# Altium footprint library LHAC-4XDSP2XV7-VP5_0226_3.PcbLib: 96 footprints (part 9 of 12) (continued)
## LCC28_1 [mil] "LCC28_1" (continued)
  text "2" at -70,247.52 h25
  text "1" at -20,227.52 h25
  text "5" at -266.06,151.46 h25
  text "7" at -266.06,51.46 h25
  text "10" at -286.06,-98.54 h25
  text "12" at -190,-244.6 h25
  text "16" at 10,-244.6 h25
  text "28" at 10,247.52 h25
  text "15" at -40,-244.6 h25
  text "27" at 60,247.52 h25
Mechanical 16:
  lines w1: -255,-255 255,-255 255,259 -255,259 -255,-255
Mechanical 17:
  text "***" at -50,-110 h30
  text "***" at -50,-80 h30
  text "SJ006" at -50,-50 h30
  text "SW128_2_LCC28_1_SJ006" at -50,-20 h30
  text ".Designator" at 42.5,12.34 h30

## LED0603 [mil] "LED0603"
pads (2):
  rect 30x32 smd: 1(-30,0) 2(30,0)

## LFCSP64VQ-P0_5-9X9 [mil] "LFCSP64VQ-P0_5-9X9"
pads (65):
  oval 31.5x11.81 smd: 1(-175.2,147.64) 2(-175.2,127.95) 3(-175.2,108.27) 4(-175.2,88.58) 5(-175.2,68.9) 6(-175.2,49.21) 7(-175.2,29.53) 8(-175.2,9.84) 9(-175.2,-9.84) 10(-175.2,-29.53) 11(-175.2,-49.21) 12(-175.2,-68.9) 13(-175.2,-88.58) 14(-175.2,-108.27) 15(-175.2,-127.95) 16(-175.2,-147.64) 33(175.2,-147.64) 34(175.2,-127.95) 35(175.2,-108.27) 36(175.2,-88.58) 37(175.2,-68.9) 38(175.2,-49.21) 39(175.2,-29.53) 40(175.2,-9.84) 41(175.2,9.84) 42(175.2,29.53) 43(175.2,49.21) 44(175.2,68.9) 45(175.2,88.58) 46(175.2,108.27) 47(175.2,127.95) 48(175.2,147.64)
  oval 11.81x31.5 smd: 17(-147.64,-175.2) 18(-127.95,-175.2) 19(-108.27,-175.2) 20(-88.58,-175.2) 21(-68.9,-175.2) 22(-49.21,-175.2) 23(-29.53,-175.2) 24(-9.84,-175.2) 25(9.84,-175.2) 26(29.53,-175.2) 27(49.21,-175.2) 28(68.9,-175.2) 29(88.58,-175.2) 30(108.27,-175.2) 31(127.95,-175.2) 32(147.64,-175.2) 49(147.64,175.2) 50(127.95,175.2) 51(108.27,175.2) 52(88.58,175.2) 53(68.9,175.2) 54(49.21,175.2) 55(29.53,175.2) 56(9.84,175.2) 57(-9.84,175.2) 58(-29.53,175.2) 59(-49.21,175.2) 60(-68.9,175.2) 61(-88.58,175.2) 62(-108.27,175.2) 63(-127.95,175.2) 64(-147.64,175.2)
  rect 297.24x297.24 smd: 65(0,0)
via -21.65,21.65 diameter 18 hole 10
via 21.65,-21.65 diameter 18 hole 10
via 21.65,21.65 diameter 18 hole 10
via -21.65,-21.65 diameter 18 hole 10
via 76.77,21.65 diameter 18 hole 10
via 76.77,-21.65 diameter 18 hole 10
via 120.08,21.65 diameter 18 hole 10
via 120.08,-21.65 diameter 18 hole 10
via 76.77,120.08 diameter 18 hole 10
via 76.77,76.77 diameter 18 hole 10
via 120.08,120.08 diameter 18 hole 10
via 120.08,76.77 diameter 18 hole 10
via -21.65,120.08 diameter 18 hole 10
via -21.65,76.77 diameter 18 hole 10
via 21.65,120.08 diameter 18 hole 10
via 21.65,76.77 diameter 18 hole 10
via -120.08,120.08 diameter 18 hole 10
via -120.08,76.77 diameter 18 hole 10
via -76.77,120.08 diameter 18 hole 10
via -76.77,76.77 diameter 18 hole 10
via -120.08,21.65 diameter 18 hole 10
via -120.08,-21.65 diameter 18 hole 10
via -76.77,21.65 diameter 18 hole 10
via -76.77,-21.65 diameter 18 hole 10
via -120.08,-76.77 diameter 18 hole 10
via -120.08,-120.08 diameter 18 hole 10
via -76.77,-76.77 diameter 18 hole 10
via -76.77,-120.08 diameter 18 hole 10
via -21.65,-76.77 diameter 18 hole 10
via -21.65,-120.08 diameter 18 hole 10
via 21.65,-76.77 diameter 18 hole 10
via 76.77,-76.77 diameter 18 hole 10
via 76.77,-120.08 diameter 18 hole 10
via 120.08,-76.77 diameter 18 hole 10
via 120.08,-120.08 diameter 18 hole 10
Top Overlay:
  circle w7: c-226,154 r11.4
  lines w7.87: -202.76,-202.76 -202.76,-155.51 -202.76,153.54 -155.51,202.76 202.76,202.76 202.76,-202.76 -202.76,-202.76
  text ".Designator" at -35,215 h25
Top Paste:
  pour cut-out: -137.8,137.8 -137.8,59.06 -59.06,59.06 -59.06,137.8
  pour cut-out: -137.8,39.37 -137.8,-39.37 -59.06,-39.37 -59.06,39.37
  pour cut-out: -137.8,-59.06 -137.8,-137.8 -59.06,-137.8 -59.06,-59.06
  pour cut-out: -39.37,-59.06 -39.37,-137.8 39.37,-137.8 39.37,-59.06
  pour cut-out: 59.06,-59.06 59.06,-137.8 137.8,-137.8 137.8,-59.06
  pour cut-out: 59.06,39.37 59.06,-39.37 137.8,-39.37 137.8,39.37
  pour cut-out: 59.06,137.8 59.06,59.06 137.8,59.06 137.8,137.8
  pour cut-out: -39.37,137.8 -39.37,59.06 39.37,59.06 39.37,137.8
  pour cut-out: -39.37,39.37 -39.37,-39.37 39.37,-39.37 39.37,39.37
Mechanical 5:
  lines w7: -237.4,154 cw(c-226,154) -226,165.4 cw(c-226,154) -214.6,154 cw(c-226,154) -226,142.6 cw(c-226,154) -237.4,154
  lines w7.87: -202.76,-202.76 -202.76,-155.51 -202.76,153.54 -155.51,202.76 202.76,202.76 202.76,-202.76 -202.76,-202.76
  text "U122" at -35,215 h25
Mechanical 14:
  text "50" at 119.95,175.2 h10
  text "48" at 167.2,147.64 h10
  text "46" at 167.2,108.27 h10
  text "63" at -135.95,175.2 h10
  text "3" at -179.2,108.27 h10
  text "1" at -179.2,147.64 h10
  text "4" at -179.2,88.58 h10
  text "51" at 100.27,175.2 h10
  text "53" at 60.9,175.2 h10
  text "59" at -57.21,175.2 h10
  text "56" at 1.84,175.2 h10
  text "52" at 80.58,175.2 h10
  text "57" at -17.84,175.2 h10
  text "58" at -37.53,175.2 h10
  text "54" at 41.21,175.2 h10
  text "44" at 167.2,68.9 h10
  text "55" at 21.53,175.2 h10
  text "14" at -183.2,-108.27 h10
  text "13" at -183.2,-88.58 h10
  text "35" at 167.2,-108.27 h10
  text "41" at 167.2,9.84 h10
  text "25" at 1.84,-175.2 h10
  text "24" at -17.84,-175.2 h10
  text "6" at -179.2,49.21 h10
  text "29" at 80.58,-175.2 h10
  text "5" at -179.2,68.9 h10
  text "22" at -57.21,-175.2 h10
  text "18" at -135.95,-175.2 h10
  text "33" at 167.2,-147.64 h10
  text "31" at 119.95,-175.2 h10
  text "27" at 41.21,-175.2 h10
  text "40" at 167.2,-9.84 h10
  text "38" at 167.2,-49.21 h10
  text "16" at -183.2,-147.64 h10
  text "11" at -183.2,-49.21 h10
  text "30" at 100.27,-175.2 h10
  text "21" at -76.9,-175.2 h10
  text "36" at 167.2,-88.58 h10
  text "17" at -155.64,-175.2 h10
  text "32" at 139.64,-175.2 h10
  text "34" at 167.2,-127.95 h10
  text "37" at 167.2,-68.9 h10
  text "19" at -116.27,-175.2 h10
  text "26" at 21.53,-175.2 h10
  text "28" at 60.9,-175.2 h10
  text "23" at -37.53,-175.2 h10
  text "20" at -96.58,-175.2 h10
  text "15" at -183.2,-127.95 h10
  text "12" at -183.2,-68.9 h10
  text "65" at -16,0 h10
  text "64" at -155.64,175.2 h10
  text "60" at -76.9,175.2 h10
  text "47" at 167.2,127.95 h10
  text "49" at 139.64,175.2 h10
  text "2" at -179.2,127.95 h10
  text "7" at -179.2,29.53 h10
  text "61" at -96.58,175.2 h10
  text "62" at -116.27,175.2 h10
  text "43" at 167.2,49.21 h10
  text "42" at 167.2,29.53 h10
  text "45" at 167.2,88.58 h10
  text "8" at -179.2,9.84 h10
  text "9" at -179.2,-9.84 h10
  text "10" at -183.2,-29.53 h10
  text "39" at 167.2,-29.53 h10
Mechanical 16:
  drawing of 201 lines, arcs and shapes, not listed
3D body: height 150, standoff 0, extent -190.94,-190.94 190.94,190.94

## LT1963A-S8 [mil]
pads (8):
  rect 70x30 smd: 1(-104.33,75) 2(-104.33,25) 3(-104.33,-25) 4(-104.33,-75) 5(104.33,-75) 6(104.33,-25) 7(104.33,25) 8(104.33,75)
Top Overlay:
  lines w7: -40,-98.43 -40,98.43 ; -170,55 -150,75 -170,95 -170,55 ; -54.02,-98.43 -54.02,98.43 54.2,98.43 54.2,-98.43 -54.02,-98.43

## LTM4644 [mil] "LTM4644"
pads (77):
  round 25 smd: A1(-150,250) A2(-100,250) A3(-50,250) A4(0,250) A5(50,250) A6(100,250) A7(150,250) B1(-150,200) B2(-100,200) B3(-50,200) B4(0,200) B5(50,200) B6(100,200) B7(150,200) C1(-150,150) C2(-100,150) C3(-50,150) C4(0,150) C5(50,150) C6(100,150) C7(150,150) D1(-150,100) D2(-100,100) D3(-50,100) D4(0,100) D5(50,100) D6(100,100) D7(150,100) E1(-150,50) E2(-100,50) E3(-50,50) E4(0,50) E5(50,50) E6(100,50) E7(150,50) F1(-150,0) F2(-100,0) F3(-50,0) F4(0,0) F5(50,0) F6(100,0) F7(150,0) G1(-150,-50) G2(-100,-50) G3(-50,-50) G4(0,-50) G5(50,-50) G6(100,-50) G7(150,-50) H1(-150,-100) H2(-100,-100) H3(-50,-100) H4(0,-100) H5(50,-100) H6(100,-100) H7(150,-100) J1(-150,-150) J2(-100,-150) J3(-50,-150) J4(0,-150) J5(50,-150) J6(100,-150) J7(150,-150) K1(-150,-200) K2(-100,-200) K3(-50,-200) K4(0,-200) K5(50,-200) K6(100,-200) K7(150,-200) L1(-150,-250) L2(-100,-250) L3(-50,-250) L4(0,-250) L5(50,-250) L6(100,-250) L7(150,-250)
Top Overlay:
  lines w1.97: -157.48,295.28 -177.17,275.59 -177.17,255.91 ; -177.17,255.91 -137.8,295.28 -177.17,255.91 ; -177.17,-295.28 177.17,-295.28 177.17,295.28 -177.17,295.28 -177.17,-295.28
  lines w9.84: -216.54,300.59 ccw(c-196.85,300.6) -196.85,280.91 ccw(c-196.85,300.59) -177.17,300.59 ccw(c-196.85,300.6) -196.85,320.28 ccw(c-196.85,300.59) -216.54,300.59
Mechanical 17:
  text "LTM4644IY" at 300,190 h25

## LTM4677 [mm] "LTM4677"
pads (144):
  round 0.62 smd: A1(-6.985,6.985) A2(-5.715,6.985) A3(-4.445,6.985) A4(-3.175,6.985) A5(-1.905,6.985) A6(-0.635,6.985) A7(0.635,6.985) A8(1.905,6.985) A9(3.175,6.985) A10(4.445,6.985) A11(5.715,6.985) A12(6.985,6.985) B1(-6.985,5.715) B2(-5.715,5.715) B3(-4.445,5.715) B4(-3.175,5.715) B5(-1.905,5.715) B6(-0.635,5.715) B7(0.635,5.715) B8(1.905,5.715) B9(3.175,5.715) B10(4.445,5.715) B11(5.715,5.715) B12(6.985,5.715) C1(-6.985,4.445) C2(-5.715,4.445) C3(-4.445,4.445) C4(-3.175,4.445) C5(-1.905,4.445) C6(-0.635,4.445) C7(0.635,4.445) C8(1.905,4.445) C9(3.175,4.445) C10(4.445,4.445) C11(5.715,4.445) C12(6.985,4.445) D1(-6.985,3.175) D2(-5.715,3.175) D3(-4.445,3.175) D4(-3.175,3.175) D5(-1.905,3.175) D6(-0.635,3.175) D7(0.635,3.175) D8(1.905,3.175) D9(3.175,3.175) D10(4.445,3.175) D11(5.715,3.175) D12(6.985,3.175) E1(-6.985,1.905) E2(-5.715,1.905) E3(-4.445,1.905) E4(-3.175,1.905) E5(-1.905,1.905) E6(-0.635,1.905) E7(0.635,1.905) E8(1.905,1.905) E9(3.175,1.905) E10(4.445,1.905) E11(5.715,1.905) E12(6.985,1.905) F1(-6.985,0.635) F2(-5.715,0.635) F3(-4.445,0.635) F4(-3.175,0.635) F5(-1.905,0.635) F6(-0.635,0.635) F7(0.635,0.635) F8(1.905,0.635) F9(3.175,0.635) F10(4.445,0.635) F11(5.715,0.635) F12(6.985,0.635) G1(-6.985,-0.635) G2(-5.715,-0.635) G3(-4.445,-0.635) G4(-3.175,-0.635) G5(-1.905,-0.635) G6(-0.635,-0.635) G7(0.635,-0.635) G8(1.905,-0.635) G9(3.175,-0.635) G10(4.445,-0.635) G11(5.715,-0.635) G12(6.985,-0.635) H1(-6.985,-1.905) H2(-5.715,-1.905) H3(-4.445,-1.905) H4(-3.175,-1.905) H5(-1.905,-1.905) H6(-0.635,-1.905) H7(0.635,-1.905) H8(1.905,-1.905) H9(3.175,-1.905) H10(4.445,-1.905) H11(5.715,-1.905) H12(6.985,-1.905) J1(-6.985,-3.175) J2(-5.715,-3.175) J3(-4.445,-3.175) J4(-3.175,-3.175) J5(-1.905,-3.175) J6(-0.635,-3.175) J7(0.635,-3.175) J8(1.905,-3.175) J9(3.175,-3.175) J10(4.445,-3.175) J11(5.715,-3.175) J12(6.985,-3.175) K1(-6.985,-4.445) K2(-5.715,-4.445) K3(-4.445,-4.445) K4(-3.175,-4.445) K5(-1.905,-4.445) K6(-0.635,-4.445) K7(0.635,-4.445) K8(1.905,-4.445) K9(3.175,-4.445) K10(4.445,-4.445) K11(5.715,-4.445) K12(6.985,-4.445) L1(-6.985,-5.715) L2(-5.715,-5.715) L3(-4.445,-5.715) L4(-3.175,-5.715) L5(-1.905,-5.715) L6(-0.635,-5.715) L7(0.635,-5.715) L8(1.905,-5.715) L9(3.175,-5.715) L10(4.445,-5.715) L11(5.715,-5.715) L12(6.985,-5.715) M1(-6.985,-6.985) M2(-5.715,-6.985) M3(-4.445,-6.985) M4(-3.175,-6.985) M5(-1.905,-6.985) M6(-0.635,-6.985) M7(0.635,-6.985) M8(1.905,-6.985) M9(3.175,-6.985) M10(4.445,-6.985) M11(5.715,-6.985) M12(6.985,-6.985)
via -3.81,2.54 diameter 0.559 hole 0.305
via -1.27,1.27 diameter 0.559 hole 0.305
via -7.62,-3.81 diameter 0.559 hole 0.305
via -6.35,-3.81 diameter 0.559 hole 0.305
via -5.08,-3.81 diameter 0.559 hole 0.305
via -7.62,-5.08 diameter 0.559 hole 0.305
via -6.35,-5.08 diameter 0.559 hole 0.305
via -5.08,-5.08 diameter 0.559 hole 0.305
via -7.62,-6.35 diameter 0.559 hole 0.305
via -6.35,-6.35 diameter 0.559 hole 0.305
via -5.08,-6.35 diameter 0.559 hole 0.305
via -7.62,-7.62 diameter 0.559 hole 0.305
via -6.35,-7.62 diameter 0.559 hole 0.305
via -5.08,-7.62 diameter 0.559 hole 0.305
via -7.62,7.62 diameter 0.559 hole 0.305
via -6.35,7.62 diameter 0.559 hole 0.305
via -5.08,7.62 diameter 0.559 hole 0.305
via -5.08,3.81 diameter 0.559 hole 0.305
via -6.35,3.81 diameter 0.559 hole 0.305
via -7.62,3.81 diameter 0.559 hole 0.305
via -5.08,5.08 diameter 0.559 hole 0.305
via -6.35,5.08 diameter 0.559 hole 0.305
via -7.62,5.08 diameter 0.559 hole 0.305
via -5.08,6.35 diameter 0.559 hole 0.305
via -6.35,6.35 diameter 0.559 hole 0.305
via -7.62,6.35 diameter 0.559 hole 0.305
via 3.81,3.81 diameter 0.559 hole 0.305
via 3.81,-2.54 diameter 0.559 hole 0.305
via -3.81,1.27 diameter 0.559 hole 0.305
via -2.54,2.54 diameter 0.559 hole 0.305
via -2.54,1.27 diameter 0.559 hole 0.305
via -2.54,-7.62 diameter 0.559 hole 0.305
via -1.27,3.81 diameter 0.559 hole 0.305
via 2.54,3.81 diameter 0.559 hole 0.305
via -2.54,-3.81 diameter 0.559 hole 0.305
via 2.54,-3.81 diameter 0.559 hole 0.305
via -1.27,-1.27 diameter 0.559 hole 0.305
via -2.54,-1.27 diameter 0.559 hole 0.305
via -1.27,-5.08 diameter 0.559 hole 0.305
via -6.35,1.27 diameter 0.559 hole 0.305
via -2.54,3.81 diameter 0.559 hole 0.305
via -3.81,-2.54 diameter 0.559 hole 0.305
via 1.27,-3.81 diameter 0.559 hole 0.305
via -6.35,2.54 diameter 0.559 hole 0.305
via -6.35,-1.27 diameter 0.559 hole 0.305
via -1.27,-2.54 diameter 0.559 hole 0.305
via -2.54,-2.54 diameter 0.559 hole 0.305
via -6.35,-2.54 diameter 0.559 hole 0.305
via -3.81,-1.27 diameter 0.559 hole 0.305
via -2.54,7.62 diameter 0.559 hole 0.305
via -1.27,2.54 diameter 0.559 hole 0.305
via 2.54,2.54 diameter 0.559 hole 0.305
via 2.54,-2.54 diameter 0.559 hole 0.305
via 1.27,-2.54 diameter 0.559 hole 0.305
via 1.27,2.54 diameter 0.559 hole 0.305
via 7.62,-7.62 diameter 0.559 hole 0.305
via 6.35,-7.62 diameter 0.559 hole 0.305
via 7.62,-6.35 diameter 0.559 hole 0.305
via 6.35,-6.35 diameter 0.559 hole 0.305
via 7.62,-5.08 diameter 0.559 hole 0.305
via 6.35,-5.08 diameter 0.559 hole 0.305
via 7.62,-3.81 diameter 0.559 hole 0.305
via 6.35,-3.81 diameter 0.559 hole 0.305
via 7.62,-2.54 diameter 0.559 hole 0.305
via 6.35,1.27 diameter 0.559 hole 0.305
via 7.62,1.27 diameter 0.559 hole 0.305
via 6.35,6.35 diameter 0.559 hole 0.305
via 7.62,6.35 diameter 0.559 hole 0.305
via 6.35,5.08 diameter 0.559 hole 0.305
via 7.62,5.08 diameter 0.559 hole 0.305
via 6.35,3.81 diameter 0.559 hole 0.305
via 7.62,3.81 diameter 0.559 hole 0.305
via 7.62,7.62 diameter 0.559 hole 0.305
via 6.35,7.62 diameter 0.559 hole 0.305
via -1.27,-6.35 diameter 0.559 hole 0.305
via -1.27,-7.62 diameter 0.559 hole 0.305
via -3.81,-6.35 diameter 0.559 hole 0.305
via -2.54,-6.35 diameter 0.559 hole 0.305
via -3.81,-7.62 diameter 0.559 hole 0.305
via 1.27,-5.08 diameter 0.559 hole 0.305
via 2.54,-5.08 diameter 0.559 hole 0.305
via 3.81,-5.08 diameter 0.559 hole 0.305
via 1.27,-6.35 diameter 0.559 hole 0.305
via 2.54,-6.35 diameter 0.559 hole 0.305
via 3.81,-6.35 diameter 0.559 hole 0.305
via 1.27,-7.62 diameter 0.559 hole 0.305
via 2.54,-7.62 diameter 0.559 hole 0.305
via 3.81,-7.62 diameter 0.559 hole 0.305
via 5.08,-7.62 diameter 0.559 hole 0.305
via 5.08,-2.54 diameter 0.559 hole 0.305
via 5.08,-3.81 diameter 0.559 hole 0.305
via 7.62,-1.27 diameter 0.559 hole 0.305
via 5.08,1.27 diameter 0.559 hole 0.305
via 5.08,-1.27 diameter 0.559 hole 0.305
via 6.35,-1.27 diameter 0.559 hole 0.305
via -3.81,6.35 diameter 0.559 hole 0.305
via -2.54,6.35 diameter 0.559 hole 0.305
via -1.27,6.35 diameter 0.559 hole 0.305
via -1.27,5.08 diameter 0.559 hole 0.305
via 1.27,6.35 diameter 0.559 hole 0.305
via 1.27,5.08 diameter 0.559 hole 0.305
via 2.54,6.35 diameter 0.559 hole 0.305
via 3.81,6.35 diameter 0.559 hole 0.305
via 2.54,5.08 diameter 0.559 hole 0.305
via 3.81,5.08 diameter 0.559 hole 0.305
via -3.81,7.62 diameter 0.559 hole 0.305
via -1.27,7.62 diameter 0.559 hole 0.305
via 3.81,7.62 diameter 0.559 hole 0.305
via 2.54,7.62 diameter 0.559 hole 0.305
via 5.08,7.62 diameter 0.559 hole 0.305
via 1.27,7.62 diameter 0.559 hole 0.305
via -3.81,-3.81 diameter 0.559 hole 0.305
via -3.81,-5.08 diameter 0.559 hole 0.305
via 2.54,1.27 diameter 0.559 hole 0.305
via 2.54,-1.27 diameter 0.559 hole 0.305
via 1.27,3.81 diameter 0.559 hole 0.305
via -3.81,3.81 diameter 0.559 hole 0.305
via -3.81,5.08 diameter 0.559 hole 0.305
via 3.81,2.54 diameter 0.559 hole 0.305
via 1.27,1.27 diameter 0.559 hole 0.305
via 1.27,-1.27 diameter 0.559 hole 0.305
via -5.08,-2.54 diameter 0.559 hole 0.305
via -5.08,-1.27 diameter 0.559 hole 0.305
via -5.08,1.27 diameter 0.559 hole 0.305
via -5.08,2.54 diameter 0.559 hole 0.305
Top Layer:
  lines w0.381: -7.62,-7.62 -6.985,-6.985 ; -7.62,-6.35 -6.985,-5.715 ; -7.62,-5.08 -6.985,-4.445 ; -7.62,-3.81 -6.985,-3.175 ; -7.62,3.81 -6.985,3.175 ; -7.62,5.08 -6.985,4.445 ; -7.62,6.35 -6.985,5.715 ; -7.62,7.62 -6.985,6.985 ; -6.35,-7.62 -5.715,-6.985 ; -6.35,-6.35 -5.715,-5.715 ; -6.35,-5.08 -5.715,-4.445 ; -6.35,-3.81 -5.715,-3.175 ; -6.35,-2.54 -5.715,-1.905 ; -6.35,-1.27 -5.715,-0.635 ; -6.35,1.27 -5.715,0.635 ; -6.35,2.54 -5.715,1.905 ; -6.35,3.81 -5.715,3.175 ; -6.35,5.08 -5.715,4.445 ; -6.35,6.35 -5.715,5.715 ; -6.35,7.62 -5.715,6.985 ; -5.08,-7.62 -4.445,-6.985 ; -5.08,-6.35 -4.445,-5.715 ; -5.08,-5.08 -4.445,-4.445 ; -5.08,-3.81 -4.445,-3.175 ; -5.08,-2.54 -4.445,-1.905 ; -5.08,-1.27 -4.445,-0.635 ; -5.08,1.27 -4.445,0.635 ; -5.08,2.54 -4.445,1.905 ; -5.08,3.81 -4.445,3.175 ; -5.08,5.08 -4.445,4.445 ; -5.08,6.35 -4.445,5.715 ; -5.08,7.62 -4.445,6.985 ; -3.81,-7.62 -3.175,-6.985 ; -3.81,-6.35 -3.175,-5.715 ; -3.81,-5.08 -3.175,-4.445 ; -3.81,-3.81 -3.175,-3.175 ; -3.81,-2.54 -3.175,-1.905 ; -3.81,-1.27 -3.175,-0.635 ; -3.81,1.27 -3.175,0.635 ; -3.81,2.54 -3.175,1.905 ; -3.81,3.81 -3.175,3.175 ; -3.81,5.08 -3.175,4.445 ; -3.81,6.35 -3.175,5.715 ; -3.81,7.62 -3.175,6.985 ; -2.54,-7.62 -1.905,-6.985 ; -2.54,-6.35 -1.905,-5.715 ; -2.54,-3.81 -1.905,-3.175 ; -2.54,-2.54 -1.905,-1.905 ; -2.54,-1.27 -1.905,-0.635 ; -2.54,1.27 -1.905,0.635 ; -2.54,2.54 -1.905,1.905 ; -2.54,3.81 -1.905,3.175 ; -2.54,6.35 -1.905,5.715 ; -2.54,7.62 -1.905,6.985 ; -1.27,-7.62 -0.635,-6.985 ; -1.27,-6.35 -0.635,-5.715 ; -1.27,-5.08 -0.635,-4.445 ; -1.27,-2.54 -0.635,-1.905 ; -1.27,-1.27 -0.635,-0.635 ; -1.27,1.27 -0.635,0.635 ; -1.27,2.54 -0.635,1.905 ; -1.27,3.81 -0.635,3.175 ; -1.27,5.08 -0.635,4.445 ; -1.27,6.35 -0.635,5.715 ; -1.27,7.62 -0.635,6.985 ; 0.635,-6.985 1.27,-7.62 ; 0.635,-5.715 1.27,-6.35 ; 0.635,-4.445 1.27,-5.08 ; 0.635,-3.175 1.27,-3.81 ; 0.635,-1.905 1.27,-2.54 ; 0.635,-0.635 1.27,-1.27 ; 0.635,0.635 1.27,1.27 ; 0.635,1.905 1.27,2.54 ; 0.635,3.175 1.27,3.81 ; 0.635,4.445 1.27,5.08 ; 0.635,5.715 1.27,6.35 ; 0.635,6.985 1.27,7.62 ; 1.905,-6.985 2.54,-7.62 ; 1.905,-5.715 2.54,-6.35 ; 1.905,-4.445 2.54,-5.08 ; 1.905,-3.175 2.54,-3.81 ; 1.905,-1.905 2.54,-2.54 ; 1.905,-0.635 2.54,-1.27 ; 1.905,0.635 2.54,1.27 ; 1.905,1.905 2.54,2.54 ; 1.905,3.175 2.54,3.81 ; 1.905,4.445 2.54,5.08 ; 1.905,5.715 2.54,6.35 ; 1.905,6.985 2.54,7.62 ; 3.175,-6.985 3.81,-7.62 ; 3.175,-5.715 3.81,-6.35 ; 3.175,-4.445 3.81,-5.08 ; 3.175,-1.905 3.81,-2.54 ; 3.175,1.905 3.81,2.54 ; 3.175,3.175 3.81,3.81 ; 3.175,4.445 3.81,5.08 ; 3.175,5.715 3.81,6.35 ; 3.175,6.985 3.81,7.62 ; 4.445,-6.985 5.08,-7.62 ; 4.445,-3.175 5.08,-3.81 ; 4.445,-1.905 5.08,-2.54 ; 4.445,-0.635 5.08,-1.27 ; 4.445,0.635 5.08,1.27 ; 4.445,6.985 5.08,7.62 ; 5.715,-6.985 6.35,-7.62 ; 5.715,-5.715 6.35,-6.35 ; 5.715,-4.445 6.35,-5.08 ; 5.715,-3.175 6.35,-3.81 ; 5.715,-0.635 6.35,-1.27 ; 5.715,0.635 6.35,1.27 ; 5.715,3.175 6.35,3.81 ; 5.715,4.445 6.35,5.08 ; 5.715,5.715 6.35,6.35 ; 5.715,6.985 6.35,7.62 ; 6.985,-6.985 7.62,-7.62 ; 6.985,-5.715 7.62,-6.35 ; 6.985,-4.445 7.62,-5.08 ; 6.985,-3.175 7.62,-3.81 ; 6.985,-1.905 7.62,-2.54 ; 6.985,-0.635 7.62,-1.27 ; 6.985,0.635 7.62,1.27 ; 6.985,3.175 7.62,3.81 ; 6.985,4.445 7.62,5.08 ; 6.985,5.715 7.62,6.35 ; 6.985,6.985 7.62,7.62
Top Overlay:
  pour cut-out: -8,8 -6.857,8 -8,6.857
  lines w0.2: -8,-8 -8,8 8,8 8,-8 -8,-8
  lines w0.254: -9.525,8.89 cw(c-8.89,8.89) -8.89,9.525 cw(c-8.89,8.89) -8.255,8.89 cw(c-8.89,8.89) -8.89,8.255 cw(c-8.89,8.89) -9.525,8.89
  text ".Designator" at -8.466,-0.002 h0.64
Mechanical 5:
  lines w0.2: -8,-8 -8,8 8,8 8,-8 -8,-8
  lines w0.254: -9.525,8.89 ccw(c-8.89,8.89) -8.89,8.255 ccw(c-8.89,8.89) -8.255,8.89 ccw(c-8.89,8.89) -8.89,9.525 ccw(c-8.89,8.89) -9.525,8.89
  text "POWER_LTM4677_1_LTM4677_LTM4677" at 0,1.951 h0.64
  text "U100" at -8.466,-0.002 h0.64
Mechanical 14:
  text "E4" at -3.175,1.397 h0.64
  text "F6" at -0.635,0.127 h0.64
  text "J1" at -6.985,-3.683 h0.64
  text "J2" at -5.715,-3.683 h0.64
  text "J3" at -4.445,-3.683 h0.64
  text "K1" at -6.985,-4.953 h0.64
  text "K2" at -5.715,-4.953 h0.64
  text "K3" at -4.445,-4.953 h0.64
  text "L1" at -6.985,-6.223 h0.64
  text "L2" at -5.715,-6.223 h0.64
  text "L3" at -4.445,-6.223 h0.64
  text "M1" at -6.985,-7.493 h0.64
  text "M2" at -5.715,-7.493 h0.64
  text "M3" at -4.445,-7.493 h0.64
  text "A1" at -6.985,6.477 h0.64
  text "A2" at -5.715,6.477 h0.64
  text "A3" at -4.445,6.477 h0.64
  text "D3" at -4.445,2.667 h0.64
  text "D2" at -5.715,2.667 h0.64
  text "D1" at -6.985,2.667 h0.64
  text "C3" at -4.445,3.937 h0.64
  text "C2" at -5.715,3.937 h0.64
  text "C1" at -6.985,3.937 h0.64
  text "B3" at -4.445,5.207 h0.64
  text "B2" at -5.715,5.207 h0.64
  text "B1" at -6.985,5.207 h0.64
  text "D9" at 3.175,2.667 h0.64
  text "H9" at 3.175,-2.413 h0.64
  text "F4" at -3.175,0.127 h0.64
  text "C10" at 4.445,3.683 h0.64
  text "E11" at 5.715,1.143 h0.64
  text "H11" at 5.715,-2.667 h0.64
  text "K10" at 4.445,-5.207 h0.64
  text "F9" at 3.175,0.127 h0.64
  text "G9" at 3.175,-1.143 h0.64
  text "B10" at 4.445,4.953 h0.64
  text "L10" at 4.445,-6.477 h0.64
  text "J6" at -0.635,-3.683 h0.64
  text "D10" at 4.445,2.413 h0.64
  text "E10" at 4.445,1.143 h0.64
  text "J9" at 3.175,-3.683 h0.64
  text "E5" at -1.905,1.397 h0.64
  text "F5" at -1.905,0.127 h0.64
  text "M5" at -1.905,-7.493 h0.64
  text "D6" at -0.635,2.667 h0.64
  text "D8" at 1.905,2.667 h0.64
  text "K5" at -1.905,-4.953 h0.64
  text "J5" at -1.905,-3.683 h0.64
  text "J8" at 1.905,-3.683 h0.64
  text "G6" at -0.635,-1.143 h0.64
  text "G5" at -1.905,-1.143 h0.64
  text "K6" at -0.635,-4.953 h0.64
  text "F2" at -5.715,0.127 h0.64
  text "F1" at -6.985,0.127 h0.64
  text "C5" at -1.905,3.937 h0.64
  text "D5" at -1.905,2.667 h0.64
  text "H4" at -3.175,-2.413 h0.64
  text "J7" at 0.635,-3.683 h0.64
  text "E2" at -5.715,1.397 h0.64
  text "E1" at -6.985,1.397 h0.64
  text "G2" at -5.715,-1.143 h0.64
  text "G1" at -6.985,-1.143 h0.64
  text "H6" at -0.635,-2.413 h0.64
  text "H5" at -1.905,-2.413 h0.64
  text "H2" at -5.715,-2.413 h0.64
  text "H1" at -6.985,-2.413 h0.64
  text "G4" at -3.175,-1.143 h0.64
  text "A5" at -1.905,6.477 h0.64
  text "E6" at -0.635,1.397 h0.64
  text "E8" at 1.905,1.397 h0.64
  text "H8" at 1.905,-2.413 h0.64
  text "H7" at 0.635,-2.413 h0.64
  text "E7" at 0.635,1.397 h0.64
  text "M12" at 6.985,-7.747 h0.64
  text "M11" at 5.715,-7.747 h0.64
  text "L12" at 6.985,-6.477 h0.64
  text "L11" at 5.715,-6.477 h0.64
  text "K12" at 6.985,-5.207 h0.64
  text "K11" at 5.715,-5.207 h0.64
  text "J12" at 6.985,-3.937 h0.64
  text "J11" at 5.715,-3.937 h0.64
  text "H12" at 6.985,-2.667 h0.64
  text "E12" at 6.985,1.143 h0.64
  text "F11" at 5.715,-0.127 h0.64
  text "F12" at 6.985,-0.127 h0.64
  text "B11" at 5.715,4.953 h0.64
  text "B12" at 6.985,4.953 h0.64
  text "C11" at 5.715,3.683 h0.64
  text "C12" at 6.985,3.683 h0.64
  text "D11" at 5.715,2.413 h0.64
  text "D12" at 6.985,2.413 h0.64
  text "A12" at 6.985,6.223 h0.64
  text "A11" at 5.715,6.223 h0.64
  text "L6" at -0.635,-6.223 h0.64
  text "M6" at -0.635,-7.493 h0.64
  text "L4" at -3.175,-6.223 h0.64
  text "L5" at -1.905,-6.223 h0.64
  text "M4" at -3.175,-7.493 h0.64
  text "K7" at 0.635,-4.953 h0.64
  text "K8" at 1.905,-4.953 h0.64
  text "K9" at 3.175,-4.953 h0.64
  text "L7" at 0.635,-6.223 h0.64
  text "L8" at 1.905,-6.223 h0.64
  text "L9" at 3.175,-6.223 h0.64
  text "M7" at 0.635,-7.493 h0.64
  text "M8" at 1.905,-7.493 h0.64
  text "M9" at 3.175,-7.493 h0.64
  text "M10" at 4.445,-7.747 h0.64
  text "H10" at 4.445,-2.667 h0.64
  text "J10" at 4.445,-3.937 h0.64
  text "G12" at 6.985,-1.397 h0.64
  text "F10" at 4.445,-0.127 h0.64
  text "G10" at 4.445,-1.397 h0.64
  text "G11" at 5.715,-1.397 h0.64
  text "B4" at -3.175,5.207 h0.64
  text "B5" at -1.905,5.207 h0.64
  text "B6" at -0.635,5.207 h0.64
  text "C6" at -0.635,3.937 h0.64
  text "B7" at 0.635,5.207 h0.64
  text "C7" at 0.635,3.937 h0.64
  text "B8" at 1.905,5.207 h0.64
  text "B9" at 3.175,5.207 h0.64
  text "C8" at 1.905,3.937 h0.64
  text "C9" at 3.175,3.937 h0.64
  text "A4" at -3.175,6.477 h0.64
  text "A6" at -0.635,6.477 h0.64
  text "A9" at 3.175,6.477 h0.64
  text "A8" at 1.905,6.477 h0.64
  text "A10" at 4.445,6.223 h0.64
  text "A7" at 0.635,6.477 h0.64
  text "J4" at -3.175,-3.683 h0.64
  text "K4" at -3.175,-4.953 h0.64
  text "F8" at 1.905,0.127 h0.64
  text "G8" at 1.905,-1.143 h0.64
  text "D7" at 0.635,2.667 h0.64
  text "D4" at -3.175,2.667 h0.64
  text "C4" at -3.175,3.937 h0.64
  text "E9" at 3.175,1.397 h0.64
  text "F7" at 0.635,0.127 h0.64
  text "G7" at 0.635,-1.143 h0.64
  text "H3" at -4.445,-2.413 h0.64
  text "G3" at -4.445,-1.143 h0.64
  text "F3" at -4.445,0.127 h0.64
  text "E3" at -4.445,1.397 h0.64
Mechanical 16:
  pour cut-out: -8,8 -6.857,8 -8,6.857
  pour cut-out: -8.25,-8.25 -8.25,8.25 8.25,8.25 8.25,-8.25
  region: -8.89,-8.89 -8.89,8.89 8.89,8.89 8.89,-8.89
  lines w0.1: -8,-8 -8,8 8,8 8,-8 -8,-8
Mechanical 17:
  text "LTM4677IY" at 0,5.334 h0.64
3D body: height 3.81, standoff 0, extent -8.89,-8.89 8.89,8.89

## MLP8_THEM1 [mil] "MLP8_THEM1"
pads (9):
  oval 25x45 smd: 1(75,157) 2(25,157) 3(-25,157) 4(-75,157) 5(-75,-157) 6(-25,-157) 7(25,-157) 8(75,-157)
  rect 188.98x183.07 smd: 9(0,0)
Top Overlay:
  lines w6: -100,-160 -120,-160 -120,160 -100,160 ; 100,-160 120,-160 120,160 100,160 ; 111.81,177.66 ccw(c121.81,177.66) 121.81,167.66 ccw(c121.81,177.66) 131.81,177.66 ccw(c121.81,177.66) 121.81,187.66 ccw(c121.81,177.66) 111.81,177.66
Mechanical 17:
  text ".Designator" at -10,-10 h31.1
  text "MT25QU256ABA1EW9-0SIT" at -100,-60 h25

## MMCX1 [mil] "MMCX1"
pads (5):
  round 47.24 hole 31.5: 1(0,0) 2(-50,50) 3(50,50) 4(-50,-50) 5(50,-50)
Top Overlay:
  lines w1: -78.74,-78.74 -78.74,78.74 78.74,78.74 78.74,-78.74 -78.74,-78.74
  text ".Designator" at -20,105 h25
Mechanical 5:
  lines w1: -78.74,-78.74 -78.74,78.74 78.74,78.74 78.74,-78.74 -78.74,-78.74
  text "X5" at -55,140 h25
Mechanical 14:
  text "1" at 0,8 h20
  text "5" at 50,-42 h20
  text "3" at 50,58 h20
  text "4" at -50,-42 h20
  text "2" at -50,58 h20
Mechanical 16:
  region: -78.74,78.74 -78.74,-78.74 78.74,-78.74 78.74,78.74
  pour cut-out: -78.74,78.74 -78.74,-78.74 78.74,-78.74 78.74,78.74
  lines w1: -78.74,-78.74 -78.74,78.74 78.74,78.74 78.74,-78.74 -78.74,-78.74
3D body: height 150, standoff 0, extent -78.74,-78.74 78.74,78.74